# Altium footprint library Resistors_SMD_IPC-SM-782.PcbLib: 200 footprints (part 9 of 13)
Each footprint in its own frame and in the unit in brackets; x right, y up, seen from the top. Pads: shape width x height; smd on the part's side, far side on the other; paste and mask are expansions set on the pad; w line width, h text height; cw(c..) or ccw(c..) is an arc to the next point about the centre after c.
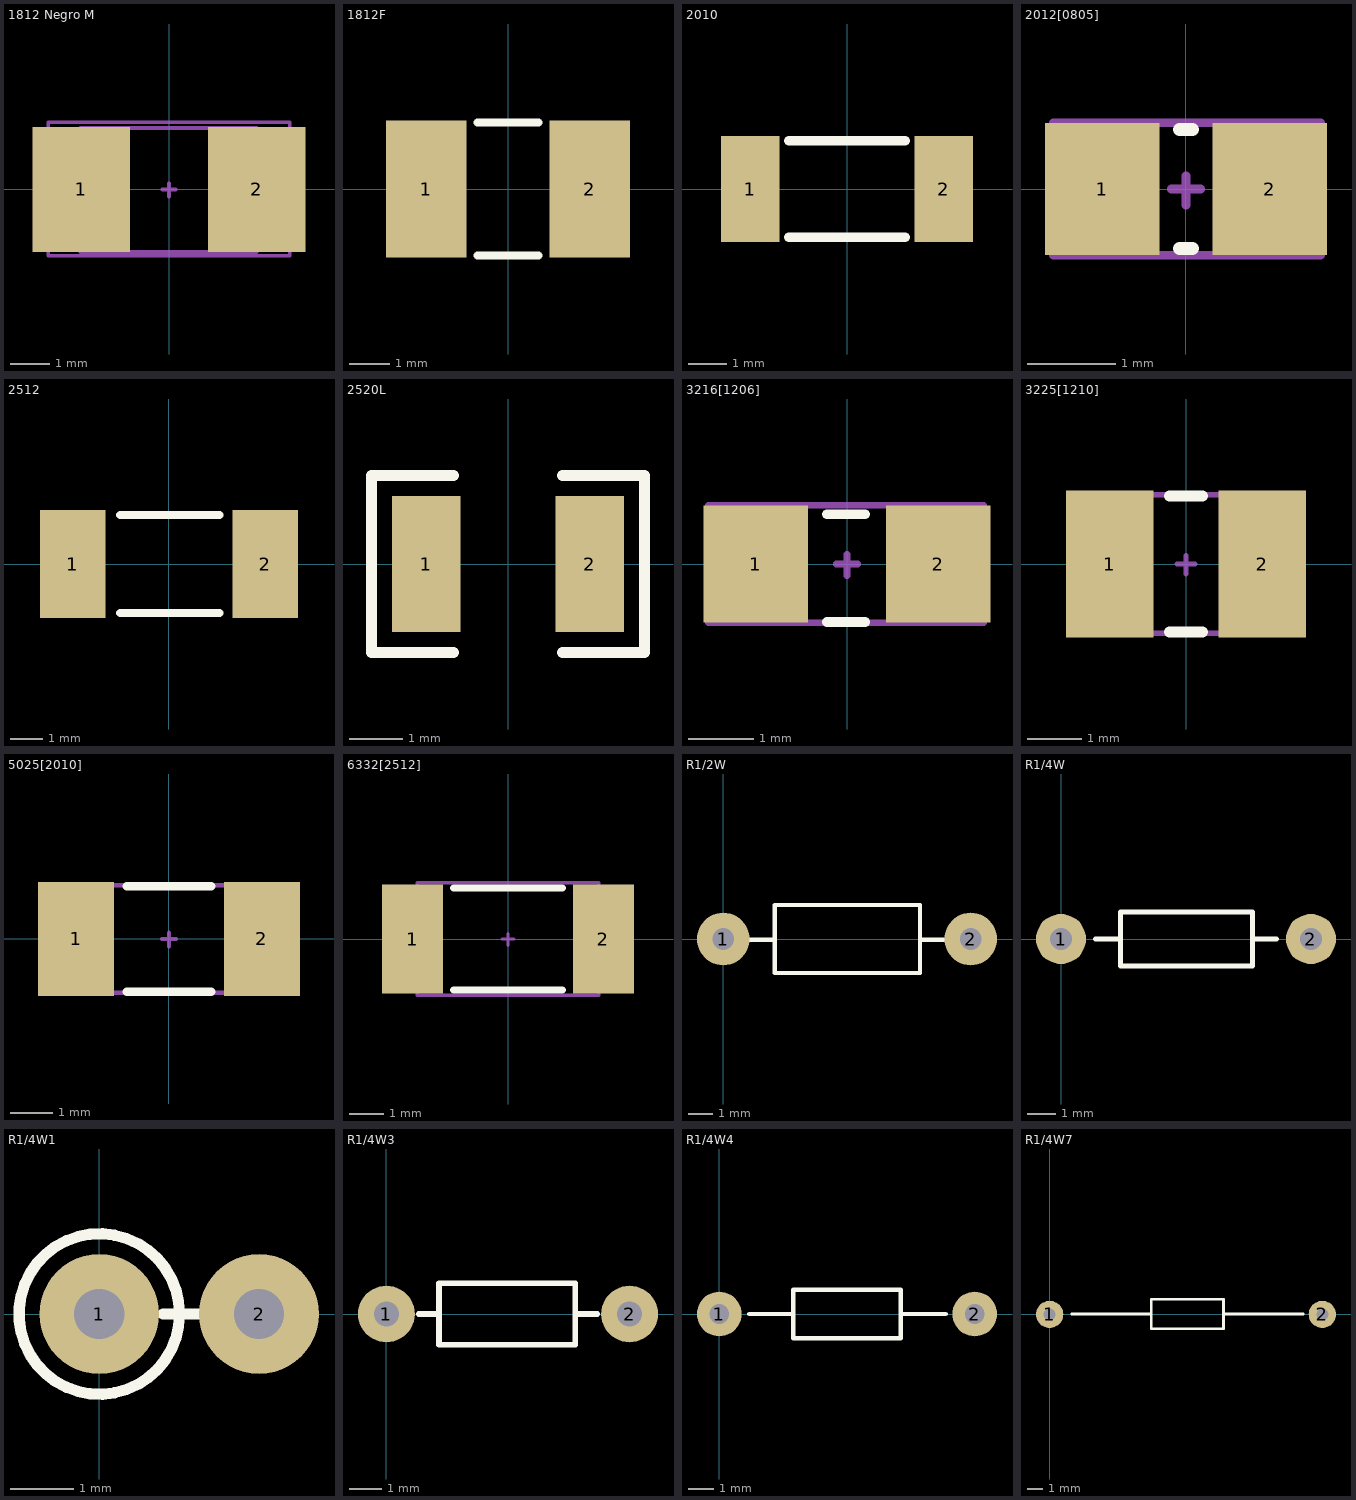
[diagram p8: the footprints below, top view; thin cyan lines are the x and y axes]

## 1812 Negro M [mm] "Chip Resistor, Empaque 1812"
height 0.3
pads (2):
  rect 2.5x3.2 smd: 1(-2.25,0) 2(2.25,0)
Mechanical 13:
  lines w0.1: -2.275,-1.6 2.25,-1.6 2.25,1.575 -2.275,1.575 -2.275,-1.6
Mechanical 15:
  lines w0.1: -0.165,0 0.165,0 ; 0,-0.18 0,0.15 ; 3.075,1.725 -3.1,1.725 -3.1,-1.7 3.1,-1.7 3.1,1.725
3D body "1812 SMD Resistor.STEP": height 1.6, standoff 0, extent -2.25,-1.6 2.25,1.6

## 1812F [mm]
pads (2):
  rect 2x3.4 smd: 1(-2.032,0) 2(2.032,0)
Top Overlay:
  lines w0.203: -0.762,-1.651 0.762,-1.651 ; -0.762,1.651 0.762,1.651
3D body "User Library-fuse1812.step": height 1.32, standoff 0, extent -2.41,-1.61 2.41,1.61

## 2010 [mil]
pads (2):
  rect 60x110 smd: 1(-100,0) 2(100,0)
Top Overlay:
  lines w10: -60,-50 60,-50 ; -60,50 60,50
3D body "User Library-Chip Resistor_2010 (5025).step": height 22.24, standoff 0, extent -98.43,-48.5 98.43,50

## 2012[0805] [mm] "Chip Resistor; Body 2.0 x 1.3 mm (LxW typ)"
height 0.65
pads (2):
  rect 1.3x1.5 smd: 1(-0.95,0) 2(0.95,0)
Top Overlay:
  lines w0.15: -0.072,-0.675 0.071,-0.675 ; -0.072,0.675 0.072,0.675
Mechanical 15:
  lines w0.1: -0.165,0 0.165,0 ; 0,-0.18 0,0.15 ; -1.5,-0.75 1.525,-0.75 1.525,0.75 -1.5,0.75 -1.5,-0.75
3D body "R_0805.step": height 0.5, standoff 0, extent -1,-0.625 1,0.625

## 2512 [mm]
pads (2):
  rect 2x3.3 smd: 1(-2.95,0) 2(2.95,0)
Top Overlay:
  lines w0.254: -1.499,-1.5 1.549,-1.5 ; -1.499,1.5 1.549,1.5
3D body "User Library-2512 SMD Resistor.step": height 1.6, standoff 0, extent -3.15,-1.476 3.2,1.524

## 2520L [mil]
pads (2):
  rect 50x100 smd: 1(-60,0) 2(60,0)
Top Overlay:
  lines w8: -40,-65 -100,-65 -100,65 -40,65 ; 40,-65 100,-65 100,65 40,65
3D body "User Library-Chip Inductor.step": height 79.37, standoff 0.63, extent -49.22,-43 49.21,43.61

## 3216[1206] [mm] "Chip Resistor; Body 3.2 x 1.6 mm (LxW typ)"
height 0.71
pads (2):
  rect 1.6x1.8 smd: 1(-1.4,0) 2(1.4,0)
Top Overlay:
  lines w0.15: -0.305,-0.889 0.279,-0.889 ; -0.305,0.762 0.279,0.762
Mechanical 15:
  lines w0.1: -0.165,0 0.165,0 ; 0,-0.18 0,0.15 ; -2.125,-0.9 2.1,-0.9 2.1,0.9 -2.125,0.9 -2.125,-0.9
3D body "R_1206.step": height 0.6, standoff 0, extent -1.6,-0.8 1.6,0.8

## 3225[1210] [mm] "Chip Resistor; Body 3.2 x 2.5 mm (LxW typ)"
height 0.71
pads (2):
  rect 1.6x2.7 smd: 1(-1.4,0) 2(1.4,0)
Top Overlay:
  lines w0.2: -0.3,-1.25 0.3,-1.25 ; -0.3,1.25 0.3,1.25
Mechanical 15:
  lines w0.1: -0.165,0 0.165,0 ; 0,-0.18 0,0.15 ; -2.125,-1.27 2.1,-1.27 2.1,1.27 -2.125,1.27 -2.125,-1.27
3D body "R_1210.step": height 0.6, standoff 0, extent -1.6,-1.25 1.6,1.25

## 5025[2010] [mm] "Chip Resistor; Body 5.0 x 2.5 mm (LxW typ)"
height 0.71
pads (2):
  rect 1.8x2.7 smd: 1(-2.2,0) 2(2.2,0)
Top Overlay:
  lines w0.2: -1,-1.25 1,-1.25 ; -1,1.25 1,1.25
Mechanical 15:
  lines w0.1: -0.165,0 0.165,0 ; 0,-0.18 0,0.15 ; -2.125,-1.27 -2.125,1.27 2.1,1.27 2.1,-1.27 -2.125,-1.27
3D body "R_2010.step": height 0.6, standoff 0, extent -2.5,-1.25 2.5,1.25

## 6332[2512] [mm] "Chip Resistor; Body 6.3 x 3.2 mm (LxW typ)"
height 0.71
pads (2):
  rect 1.8x3.2 smd: 1(-2.8,0) 2(2.8,0)
Top Overlay:
  lines w0.2: -1.6,-1.5 1.6,-1.5 ; -1.6,1.5 1.6,1.5
Mechanical 15:
  lines w0.1: -0.165,0 0.165,0 ; 0,-0.18 0,0.15 ; -2.667,-1.651 -2.667,1.651 2.667,1.651 2.667,-1.651 -2.667,-1.651
3D body "R_2512.STEP": height 0.6, standoff 0, extent -3.2,-1.6 3.2,1.6

## R1/2W [mil] "R 1/2W, 2 pin, 300mil"
height 100
pads (2):
  round 85 hole 35: 1(0,0) 2(400,0)
Top Overlay:
  lines w7: 42,-1 83,-1 ; 318,-1 356,-1 ; 83,-55 83,55 318,55 318,-55 83,-55
3D body "SW3dPS-AXIAL_RESISTOR(0.25W).STEP": height 91.42, standoff -70, extent -11.6,-45.49 413.6,49

## R1/4W [mil] "R 1/4W, 2 Pin, 350mil"
height 100
pads (2):
  round 70 hole 31: 1(0,0) 2(350,0)
Top Overlay:
  lines w7: 48,0 83,0 ; 268,0 302,0 ; 83,-38 268,-38 268,38 83,38 83,-38
3D body "SW3dPS-AXIAL_RESISTOR(0.25W).STEP": height 111.42, standoff -50, extent -39.6,-47 385.6,47.49

## R1/4W1 [mm] "R 1/4W, 2 Pin, 150mil"
height 2.54
pads (2):
  round 1.905 hole 0.8: 1(0,0) 2(2.54,0)
Top Overlay:
  circle w0.178: c0,0 r1.276
  lines w0.178: 1.016,0 1.651,0
3D body "SW3dPS-Res_Stand.STEP": height 7.3, standoff -1.45, extent -0.889,-0.92 2.823,0.92

## R1/4W3 [mil] "R 1/4W, 2 Pin, 350mil"
height 100
pads (2):
  round 70 hole 31: 1(0,0) 2(300,0)
Top Overlay:
  lines w7: 40,0 65,0 ; 233,0 260,0 ; 65,-38 233,-38 233,38 65,38 65,-38
3D body "SW3DPS-RESISTOR 7_62MM DIP-DEFAULT.STEP": height 79.37, standoff -78.11, extent -9.45,-40 309.45,38.74

## R1/4W4 [mil] "R 1/4W, 2 Pin, 400mil"
height 100
pads (2):
  round 70 hole 31: 1(0,0) 2(400,0)
Top Overlay:
  lines w7: 47,0 116,0 ; 284,0 355,0 ; 116,-38 284,-38 284,38 116,38 116,-38
3D body "SW3dPS-RESISTOR, 0.25 W, 0.4 IN LEAD PITCH.STEP": height 115.5, standoff -100, extent -12,-45 412,46

## R1/4W7 [mil] "R 1/4W, 2 Pin, 600mil"
height 100
pads (2):
  round 70 hole 31: 1(0,0) 2(700,0)
Top Overlay:
  lines w7: 57,1 261,1 ; 446,1 651,1 ; 261,-37 446,-37 446,39 261,39 261,-37
3D body "SW3dPS-Resistor 5-band.STEP": height 142, standoff -125, extent 4.25,-65 705.75,67